# Altium footprint library Tomra_Cadstar_Footprints.PcbLib: 373 footprints (part 9 of 24)
Each footprint in its own frame and in the unit in brackets; x right, y up, seen from the top. Pads: shape width x height; smd on the part's side, far side on the other; paste and mask are expansions set on the pad; w line width, h text height; cw(c..) or ccw(c..) is an arc to the next point about the centre after c.
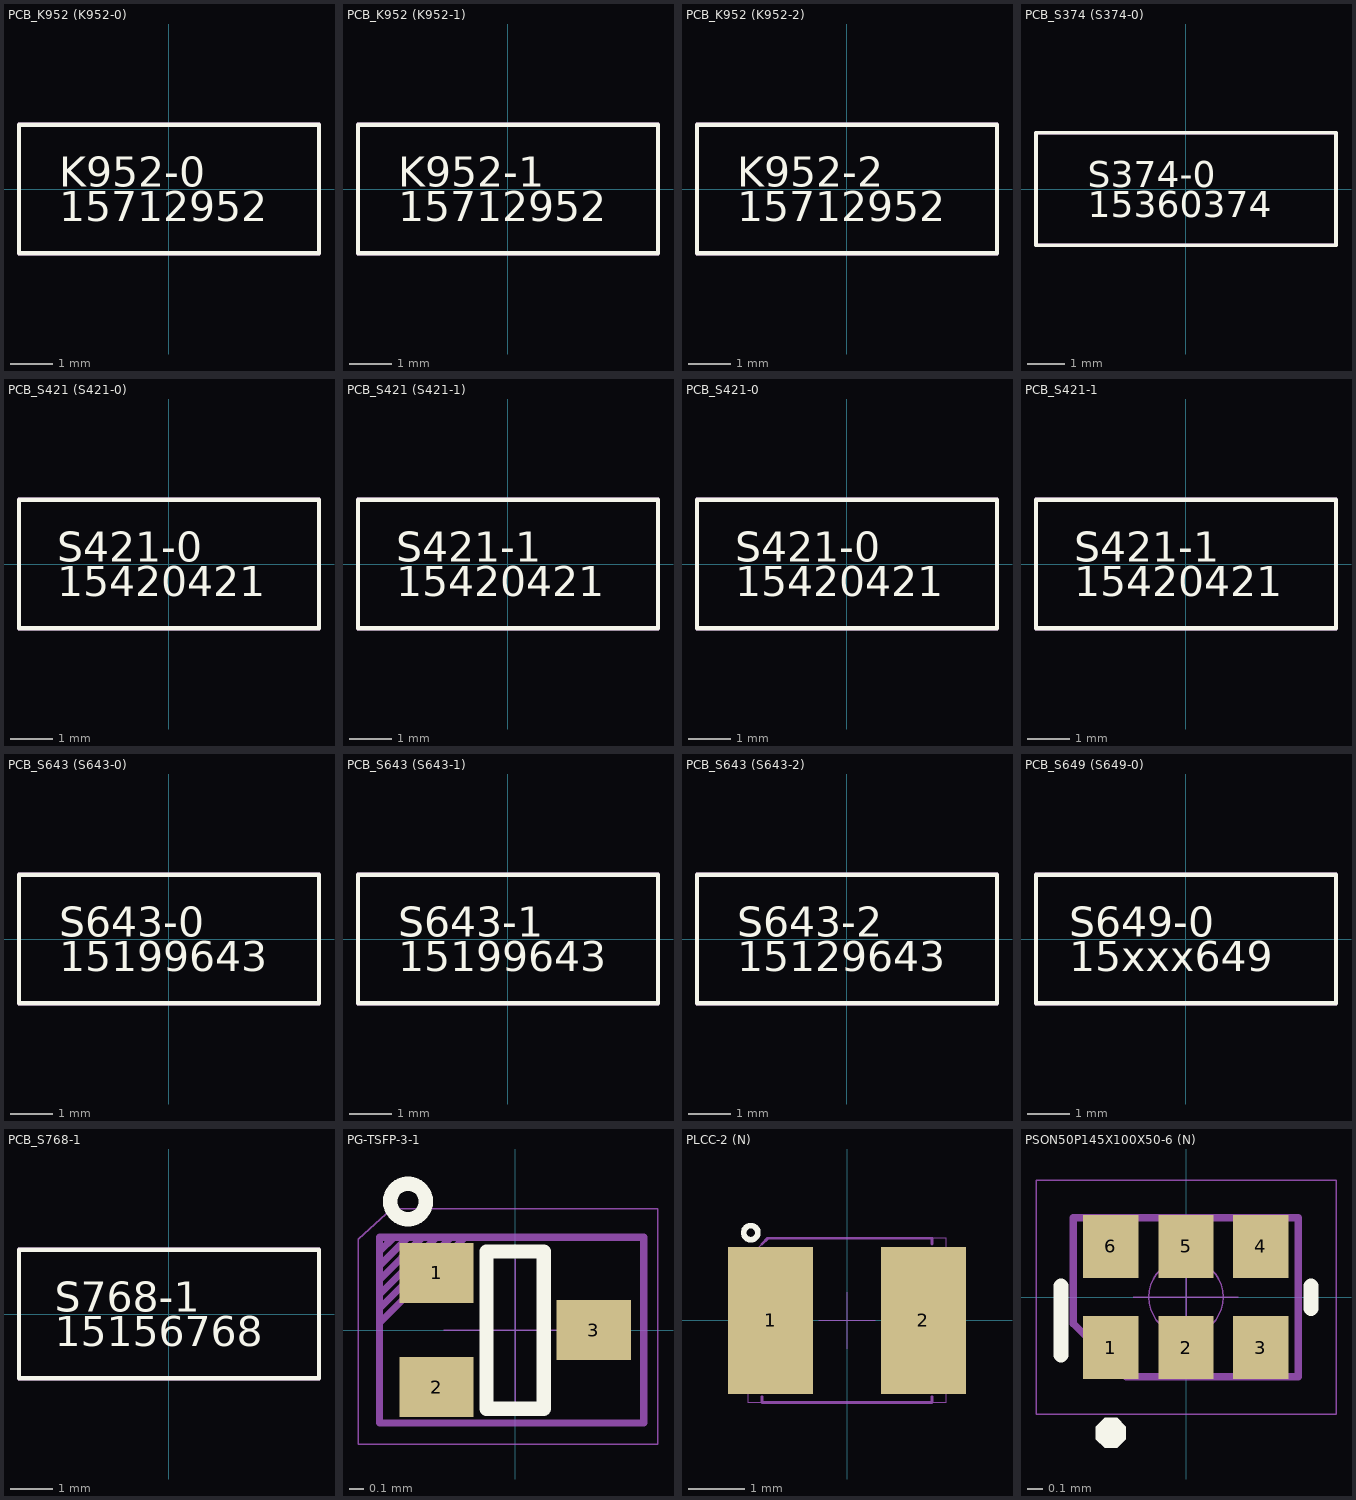
[diagram p8: the footprints below, top view; thin cyan lines are the x and y axes]

## PCB_K952 (K952-0) [mm]
height 0.1
Top Silk:
  lines w0.1: -3.5,-1.5 3.5,-1.5 3.5,1.5 -3.5,1.5 -3.5,-1.5
  text "15712952" at -2.566,-0.75 h0.7
  text "K952-0" at -2.566,0.05 h0.7
Top Placement:
  lines w0.1: -3.5,-1.5 3.5,-1.5 3.5,1.5 -3.5,1.5 -3.5,-1.5
  text "15712952" at -2.566,-0.75 h0.7
  text "K952-0" at -2.566,0.05 h0.7

## PCB_K952 (K952-1) [mm]
height 0.1
Top Silk:
  lines w0.1: -3.5,-1.5 3.5,-1.5 3.5,1.5 -3.5,1.5 -3.5,-1.5
  text "15712952" at -2.566,-0.75 h0.7
  text "K952-1" at -2.566,0.05 h0.7
Top Placement:
  lines w0.1: -3.5,-1.5 3.5,-1.5 3.5,1.5 -3.5,1.5 -3.5,-1.5
  text "15712952" at -2.566,-0.75 h0.7
  text "K952-1" at -2.566,0.05 h0.7

## PCB_K952 (K952-2) [mm]
height 0.1
Top Silk:
  lines w0.1: -3.5,-1.5 3.5,-1.5 3.5,1.5 -3.5,1.5 -3.5,-1.5
  text "15712952" at -2.566,-0.75 h0.7
  text "K952-2" at -2.566,0.05 h0.7
Top Placement:
  lines w0.1: -3.5,-1.5 3.5,-1.5 3.5,1.5 -3.5,1.5 -3.5,-1.5
  text "15712952" at -2.566,-0.75 h0.7
  text "K952-2" at -2.566,0.05 h0.7

## PCB_S374 (S374-0) [mm]
height 0.1
Top Silk:
  lines w0.1: -4,-1.5 4,-1.5 4,1.5 -4,1.5 -4,-1.5
  text "15360374" at -2.624,-0.75 h0.7
  text "S374-0" at -2.624,0.05 h0.7
Top Placement:
  lines w0.1: -4,-1.5 4,-1.5 4,1.5 -4,1.5 -4,-1.5
  text "15360374" at -2.624,-0.75 h0.7
  text "S374-0" at -2.624,0.05 h0.7

## PCB_S421 (S421-0) [mm]
height 0.1
Top Silk:
  lines w0.1: -3.5,-1.5 3.5,-1.5 3.5,1.5 -3.5,1.5 -3.5,-1.5
  text "15420421" at -2.608,-0.75 h0.7
  text "S421-0" at -2.608,0.05 h0.7
Top Placement:
  lines w0.1: -3.5,-1.5 3.5,-1.5 3.5,1.5 -3.5,1.5 -3.5,-1.5
  text "15420421" at -2.608,-0.75 h0.7
  text "S421-0" at -2.608,0.05 h0.7

## PCB_S421 (S421-1) [mm]
height 0.1
Top Silk:
  lines w0.1: -3.5,-1.5 3.5,-1.5 3.5,1.5 -3.5,1.5 -3.5,-1.5
  text "15420421" at -2.608,-0.75 h0.7
  text "S421-1" at -2.608,0.05 h0.7
Top Placement:
  lines w0.1: -3.5,-1.5 3.5,-1.5 3.5,1.5 -3.5,1.5 -3.5,-1.5
  text "15420421" at -2.608,-0.75 h0.7
  text "S421-1" at -2.608,0.05 h0.7

## PCB_S421-0 [mm]
height 0.1
Top Silk:
  lines w0.1: -3.5,-1.5 3.5,-1.5 3.5,1.5 -3.5,1.5 -3.5,-1.5
  text "15420421" at -2.608,-0.75 h0.7
  text "S421-0" at -2.608,0.05 h0.7
Top Placement:
  lines w0.1: -3.5,-1.5 3.5,-1.5 3.5,1.5 -3.5,1.5 -3.5,-1.5
  text "15420421" at -2.608,-0.75 h0.7
  text "S421-0" at -2.608,0.05 h0.7

## PCB_S421-1 [mm]
height 0.1
Top Silk:
  lines w0.1: -3.5,-1.5 3.5,-1.5 3.5,1.5 -3.5,1.5 -3.5,-1.5
  text "15420421" at -2.608,-0.75 h0.7
  text "S421-1" at -2.608,0.05 h0.7
Top Placement:
  lines w0.1: -3.5,-1.5 3.5,-1.5 3.5,1.5 -3.5,1.5 -3.5,-1.5
  text "15420421" at -2.608,-0.75 h0.7
  text "S421-1" at -2.608,0.05 h0.7

## PCB_S643 (S643-0) [mm]
height 0.1
Top Silk:
  lines w0.1: -3.5,-1.5 3.5,-1.5 3.5,1.5 -3.5,1.5 -3.5,-1.5
  text "15199643" at -2.566,-0.75 h0.7
  text "S643-0" at -2.566,0.05 h0.7
Top Placement:
  lines w0.1: -3.5,-1.5 3.5,-1.5 3.5,1.5 -3.5,1.5 -3.5,-1.5
  text "15199643" at -2.566,-0.75 h0.7
  text "S643-0" at -2.566,0.05 h0.7

## PCB_S643 (S643-1) [mm]
height 0.1
Top Silk:
  lines w0.1: -3.5,-1.5 3.5,-1.5 3.5,1.5 -3.5,1.5 -3.5,-1.5
  text "15199643" at -2.566,-0.75 h0.7
  text "S643-1" at -2.566,0.05 h0.7
Top Placement:
  lines w0.1: -3.5,-1.5 3.5,-1.5 3.5,1.5 -3.5,1.5 -3.5,-1.5
  text "15199643" at -2.566,-0.75 h0.7
  text "S643-1" at -2.566,0.05 h0.7

## PCB_S643 (S643-2) [mm]
height 0.1
Top Silk:
  lines w0.1: -3.5,-1.5 3.5,-1.5 3.5,1.5 -3.5,1.5 -3.5,-1.5
  text "15129643" at -2.566,-0.75 h0.7
  text "S643-2" at -2.566,0.05 h0.7
Top Placement:
  lines w0.1: -3.5,-1.5 3.5,-1.5 3.5,1.5 -3.5,1.5 -3.5,-1.5
  text "15129643" at -2.566,-0.75 h0.7
  text "S643-2" at -2.566,0.05 h0.7

## PCB_S649 (S649-0) [mm]
height 0.1
Top Silk:
  lines w0.1: -3.5,-1.5 3.5,-1.5 3.5,1.5 -3.5,1.5 -3.5,-1.5
  text "15xxx649" at -2.724,-0.75 h0.7
  text "S649-0" at -2.724,0.05 h0.7
Top Placement:
  lines w0.1: -3.5,-1.5 3.5,-1.5 3.5,1.5 -3.5,1.5 -3.5,-1.5
  text "15xxx649" at -2.724,-0.75 h0.7
  text "S649-0" at -2.724,0.05 h0.7

## PCB_S768-1 [mm]
height 0.1
Top Silk:
  lines w0.1: -3.5,-1.5 3.5,-1.5 3.5,1.5 -3.5,1.5 -3.5,-1.5
  text "15156768" at -2.666,-0.75 h0.7
  text "S768-1" at -2.666,0.05 h0.7
Top Placement:
  lines w0.1: -3.5,-1.5 3.5,-1.5 3.5,1.5 -3.5,1.5 -3.5,-1.5
  text "15156768" at -2.666,-0.75 h0.7
  text "S768-1" at -2.666,0.05 h0.7

## PG-TSFP-3-1 [mm]
height 0.6
pads (3):
  rect 0.52x0.42 smd paste+0 mask+0: 1(-0.55,0.4) 2(-0.55,-0.4) 3(0.55,0)
Top Silk:
  lines w0.1: -0.875,0.9 cw(c-0.75,0.9) -0.625,0.9 cw(c-0.75,0.9) -0.875,0.9 ; -0.2,-0.55 0.2,-0.55 0.2,0.55 -0.2,0.55 -0.2,-0.55
  text ".Designator" at -3.599,0 h0.7
Top Assembly:
  lines w0.05: -0.95,0.05 -0.35,0.65 ; -0.95,0.15 -0.45,0.65 ; -0.95,0.25 -0.55,0.65 ; -0.95,0.35 -0.65,0.65 ; -0.95,0.45 -0.75,0.65 ; -0.95,0.55 -0.85,0.65 ; -0.95,-0.65 0.9,-0.65 0.9,0.65 -0.95,0.65 -0.95,-0.65
Top Placement:
  lines w0.01: -0.5,0 0.5,0 ; 0,-0.5 0,0.5 ; -1.1,-0.8 1,-0.8 1,0.85 -0.865,0.85 -1.1,0.636 -1.1,-0.8

## PLCC-2 (N) [mm]
height 2
pads (2):
  rrect0% 1.5x2.6 smd paste+0 mask+0: 1(-1.35,0) 2(1.35,0)
Top Silk:
  lines w0.1: -1.825,1.55 cw(c-1.7,1.55) -1.575,1.55 cw(c-1.7,1.55) -1.825,1.55
  text ".Designator" at -3.599,-0.35 h0.7
Top Assembly:
  lines w0.05: -1.5,-1.35 -1.5,-1.45 1.5,-1.45 1.5,-1.35 ; -1.5,1.35 -1.4,1.45 1.5,1.45 1.5,1.35
Top Placement:
  lines w0.01: -0.5,0 0.5,0 ; 0,-0.5 0,0.5 ; -1.75,-1.45 1.75,-1.45 1.75,1.45 -1.4,1.45 -1.75,1.1 -1.75,-1.45

## PSON50P145X100X50-6 (N) [mm]
height 0.5
pads (6):
  rect 0.37x0.42 smd paste+0 mask+0: 1(-0.5,-0.337) 2(0,-0.337) 3(0.5,-0.337) 4(0.5,0.337) 5(0,0.337) 6(-0.5,0.337)
Top Silk:
  region: -0.6,-0.905 -0.6,-0.864 -0.541,-0.805 -0.459,-0.805 -0.4,-0.864 -0.4,-0.905 -0.4,-0.946 -0.459,-1.005 -0.541,-1.005 -0.6,-0.946
  lines w0.1: -0.835,-0.385 -0.835,0.075 ; 0.835,-0.075 0.835,0.075
  text ".Designator" at -3.599,-0.35 h0.7
Top Assembly:
  lines w0.05: -0.75,-0.177 -0.397,-0.53 0.75,-0.53 0.75,0.53 -0.75,0.53 -0.75,-0.177
Top Placement:
  lines w0.01: -0.35,0 0.35,0 ; 0,-0.35 0,0.35 ; -1,-0.78 -1,0.78 1,0.78 1,-0.78 -1,-0.78 ; -0.25,0 cw(c0,0) 0.25,0 cw(c0,0) -0.25,0